# Altium footprint library Footprint.PcbLib: 137 footprints (part 3 of 9)
Each footprint in its own frame and in the unit in brackets; x right, y up, seen from the top. Pads: shape width x height; smd on the part's side, far side on the other; paste and mask are expansions set on the pad; w line width, h text height; cw(c..) or ccw(c..) is an arc to the next point about the centre after c.
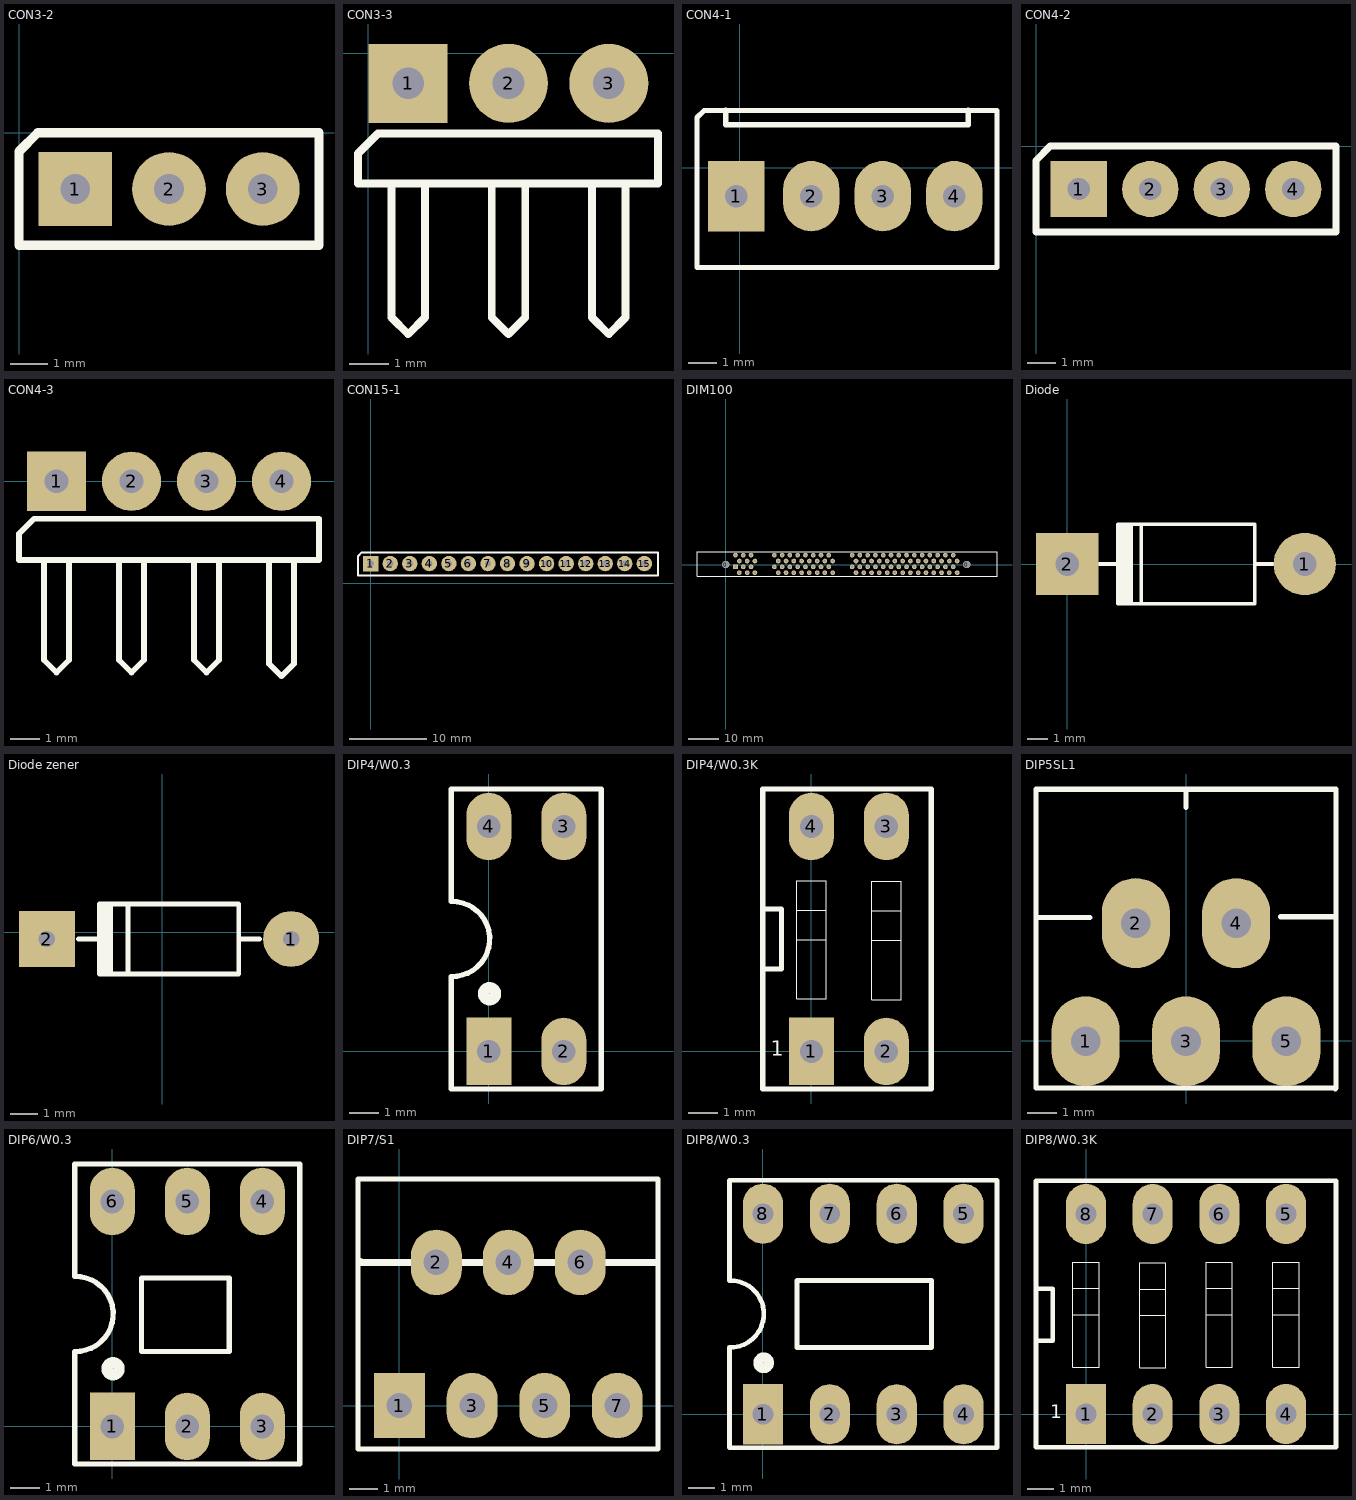
[diagram p2: the footprints below, top view; thin cyan lines are the x and y axes]

## CON3-2 [mm] "CON3 THANG"
pads (3):
  rect 2x2 hole 0.8: 1(1.524,-1.524)
  round 2 hole 0.8: 2(4.064,-1.524) 3(6.604,-1.524)
Top Overlay:
  lines w0.254: 0,-3.048 0,-0.508 0.508,0 8.128,0 8.128,-3.048 0,-3.048
3D body "Samtec-TSW-103-07-G-S.step": height 2.11, standoff -8.81, extent 0.254,-2.794 7.874,-0.254

## CON3-3 [mm] "CON3 L"
pads (3):
  rect 2x2 hole 0.8: 1(1.016,-0.762)
  round 2 hole 0.8: 2(3.556,-0.762) 3(6.096,-0.762)
Top Overlay:
  lines w0.2: 0.593,-3.302 0.593,-6.689 1.016,-7.112 1.439,-6.689 1.439,-3.302 ; 3.133,-3.302 3.133,-6.689 3.556,-7.112 3.979,-6.689 3.979,-3.302 ; 5.673,-3.302 5.673,-6.689 6.096,-7.112 6.519,-6.689 6.519,-3.302 ; -0.254,-3.302 7.341,-3.302 7.341,-2.032 0.254,-2.032 -0.254,-2.54 -0.254,-3.302
3D body "User Library-0_1inch pin strip right angle (2).step": height 4.35, standoff -2.97, extent -0.254,-7.762 7.366,0.508

## CON4-1 [mm] "CON4 pin khuyet"
pads (4):
  rect 2x2.5 hole 0.8: 1(-0.127,-1.016)
  oval 2x2.5 hole 0.8: 2(2.54,-1.016) 3(5.08,-1.016) 4(7.62,-1.016)
Top Overlay:
  lines w0.178: -1.524,-3.556 9.144,-3.556 9.144,-0.254 9.144,2.032 -1.27,2.032 -1.524,1.778 -1.524,-3.556
  lines w0.2: -0.508,2.032 -0.508,1.524 7.874,1.524 8.128,1.524 8.128,2.032
3D body "User Library-molex kk 0_1in latching 4 way vertical header.step": height 11.9, standoff -3.34, extent -1.27,-4.064 8.89,1.778

## CON4-2 [mm] "CON4 THANG"
pads (4):
  rect 2x2 hole 0.8: 1(1.524,-1.524)
  round 2 hole 0.8: 2(4.064,-1.524) 3(6.604,-1.524) 4(9.144,-1.524)
Top Overlay:
  lines w0.254: 0,-3.048 10.668,-3.048 10.668,0 0.508,0 0,-0.508 0,-3.048
3D body "User Library-Header 4 Vertical.step": height 8.13, standoff -2.72, extent 0.508,-2.692 10.262,-0.356

## CON4-3 [mm] "CON4 L"
pads (4):
  rect 2x2 hole 0.8: 1(2.54,0)
  round 2 hole 0.8: 2(5.08,0) 3(7.62,0) 4(10.16,0)
Top Overlay:
  lines w0.2: 2.117,-2.667 2.117,-6.054 2.54,-6.477 2.963,-6.054 2.963,-2.667 ; 4.657,-2.667 4.657,-6.054 5.08,-6.477 5.503,-6.054 5.503,-2.667 ; 7.197,-2.667 7.197,-6.054 7.62,-6.477 8.043,-6.054 8.043,-2.667 ; 9.737,-2.794 9.737,-6.181 10.16,-6.604 10.583,-6.181 10.583,-2.794 ; 1.27,-2.667 1.27,-1.778 1.778,-1.27 11.43,-1.27 11.43,-2.667 1.27,-2.667
3D body "CircuitWorks-HEADER 2_54 HORIZONTAL 4X.step": height 2.75, standoff -1.75, extent 1.27,-9.79 11.43,0.53

## CON15-1 [mm] "CON15 PIN THANG"
pads (15):
  rect 2x2 hole 0.8: 1(0,2.54)
  round 2 hole 0.8: 2(2.54,2.54) 3(5.08,2.54) 4(7.62,2.54) 5(10.16,2.54) 6(12.7,2.54) 7(15.24,2.54) 8(17.78,2.54) 9(20.32,2.54) 10(22.86,2.54) 11(25.4,2.54) 12(27.94,2.54) 13(30.48,2.54) 14(33.02,2.54) 15(35.56,2.54)
Top Overlay:
  lines w0.254: -1.653,0.963 37.338,0.963 37.338,4.011 -1.145,4.011 -1.653,3.503 -1.653,0.963
3D body "6215.stp": height 9.6, standoff -2.55, extent -1.27,1.27 36.83,3.81

## DIM100 [mil] "DIM100 (RAM)"
pads (102):
  round 94.49 hole 94.49: 0(0,0) 0(3100,0)
  rect 60x60 hole 30: 1(124.8,-30.31)
  round 60 hole 30: 2(174.8,-105.51) 3(224.8,-30.31) 4(274.8,-105.51) 5(324.8,-30.31) 6(374.8,-105.51) 7(624.8,-30.31) 8(674.8,-105.51) 9(724.8,-30.31) 10(774.8,-105.51) 11(824.8,-30.31) 12(874.8,-105.51) 13(924.8,-30.31) 14(974.8,-105.51) 15(1024.8,-30.31) 16(1074.8,-105.51) 17(1124.8,-30.31) 18(1174.8,-105.51) 19(1224.8,-30.31) 20(1274.8,-105.51) 21(1324.8,-30.31) 22(1374.8,-105.51) 23(1624.8,-30.31) 24(1674.8,-105.51) 25(1724.8,-30.31) 26(1774.8,-105.51) 27(1824.8,-30.31) 28(1874.8,-105.51) 29(1924.8,-30.31) 30(1974.8,-105.51) 31(2024.8,-30.31) 32(2074.8,-105.51) 33(2124.8,-30.31) 34(2174.8,-105.51) 35(2224.8,-30.31) 36(2274.8,-105.51) 37(2324.8,-30.31) 38(2374.8,-105.51) 39(2424.8,-30.31) 40(2474.8,-105.51) 41(2524.8,-30.31) 42(2574.8,-105.51) 43(2624.8,-30.31) 44(2674.8,-105.51) 45(2724.8,-30.31) 46(2774.8,-105.51) 47(2824.8,-30.31) 48(2874.8,-105.51) 49(2924.8,-30.31) 50(2974.8,-105.51) 51(124.8,120.08) 52(174.8,44.88) 53(224.8,120.08) 54(274.8,44.88) 55(324.8,120.08) 56(374.8,44.88) 57(624.8,120.08) 58(674.8,44.88) 59(724.8,120.08) 60(774.8,44.88) 61(824.8,120.08) 62(874.8,44.88) 63(924.8,120.08) 64(974.8,44.88) 65(1024.8,120.08) 66(1074.8,44.88) 67(1124.8,120.08) 68(1174.8,44.88) 69(1224.8,120.08) 70(1274.8,44.88) 71(1324.8,120.08) 72(1374.8,44.88) 73(1624.8,120.08) 74(1674.8,44.88) 75(1724.8,120.08) 76(1774.8,44.88) 77(1824.8,120.08) 78(1874.8,44.88) 79(1924.8,120.08) 80(1974.8,44.88) 81(2024.8,120.08) 82(2074.8,44.88) 83(2124.8,120.08) 84(2174.8,44.88) 85(2224.8,120.08) 86(2274.8,44.88) 87(2324.8,120.08) 88(2374.8,44.88) 89(2424.8,120.08) 90(2474.8,44.88) 91(2524.8,120.08) 92(2574.8,44.88) 93(2624.8,120.08) 94(2674.8,44.88) 95(2724.8,120.08) 96(2774.8,44.88) 97(2824.8,120.08) 98(2874.8,44.88) 99(2924.8,120.08) 100(2974.8,44.88)
Top Overlay:
  lines w7.87: -370.08,-150.79 -370.08,164.17 3488.19,164.17 3488.19,-150.79 -370.08,-150.79

## Diode [mm] "diode pitch = 450mil"
height 2.54
pads (2):
  round 3 hole 1.143: 1(11.43,0)
  rect 3x3 hole 1.143: 2(0,0)
Top Overlay:
  rectangle: 2.413,-1.905 3.175,1.905
  lines w0.178: 1.549,0 2.438,0 ; 2.438,-0.787 2.438,0 ; 2.438,0.813 2.438,0 ; 3.556,-1.905 3.556,1.905 ; 9.017,0 9.931,0 ; 2.438,-1.905 9.017,-1.905 9.017,1.905 2.438,1.905 2.438,-1.905
3D body "SW3DPS-DIODE0_4-DEFAULT.STEP": height 2.55, standoff -2.54, extent 0.127,-1.194 11.049,1.372

## Diode zener [mil] "diode zener 1A"
pads (2):
  round 80 hole 23.62: 1(185,-10)
  rect 80x80 hole 23.62: 2(-165,-10)
Top Overlay:
  rectangle: -90,-60 -70,40
  lines w7: -120,-10 -90,-10 ; -90,-26 -90,-10 ; -90,11 -90,-10 ; -49,-60 -49,37 ; 110,-10 140,-10 ; -90,-10 -90,40 110,40 110,-60 -90,-60 -90,-10
3D body "SW3dPS-do_35.STEP": height 84.5, standoff -100, extent -201.49,-43 219.49,26

## DIP4/W0.3 [mil] "4 PIN, W 300mil, Pin to pin 100mil"
height 100
pads (4):
  rect 60x90 hole 31: 1(0,0)
  oval 60x90 hole 31: 2(100,0) 3(100,300) 4(0,300)
Top Overlay:
  circle w15: c1,77 r8
  lines w7: -50.38,100.05 ccw(c-48.69,150.02) -50,200 ; -50,100 -50,-50 150,-50 150,350 -50,350 -50,201
3D body "SW3DPS-DIP4-DEFAULT.STEP": height 169.69, standoff -129.13, extent -59.06,-10 159.06,304.96

## DIP4/W0.3K [mil] "4 PINs, W=400mil,Pitch=100mil"
height 100
pads (4):
  rect 60x90 hole 31: 1(0,0)
  oval 60x90 hole 31: 2(100,0) 3(100,300) 4(0,300)
Top Overlay:
  lines w1.5: -19.68,149 19.68,149 ; -19.68,188.37 19.68,188.37 ; 80.31,148 119.69,148 ; 80.31,187.37 119.69,187.37 ; -19.68,70.26 19.68,70.26 19.68,227.74 -19.68,227.74 -19.68,70.26 ; 80.31,69.26 119.69,69.26 119.69,226.74 80.31,226.74 80.31,69.26
  lines w7: -65,110 -40,110 -40,190 -65,190 ; -65,-50 160,-50 160,350 -65,350 -65,-50
  text "1" at -54,-6 h20
3D body "User Library-Switch-Piano-DIP-2.STEP": height 354.33, standoff -157.48, extent -66.22,-103.43 170,343.43

## DIP5SL1 [mm] "DIP5SL1 (TDA2003,"
pads (5):
  oval 2.3x3.048 hole 1: 1(-3.406,-0.019) 2(-1.706,3.981) 3(-0.006,-0.019) 4(1.694,3.981) 5(3.394,-0.019)
Top Overlay:
  lines w0.178: -5.082,4.172 -3.253,4.172 ; -0.006,7.899 -0.006,8.484 ; 3.198,4.198 5.027,4.198 ; -5.086,-1.6 5.024,-1.6 5.049,-1.626 5.074,-1.6 5.074,8.516 -5.086,8.516 -5.086,-1.6
3D body "TO220-5.STEP": height 18.81, standoff -9.47, extent -4.999,-0.265 5.201,8.291

## DIP6/W0.3 [mil] "6 PIN, W 300mil, Pin to pin 100mil"
height 100
pads (6):
  rect 60x90 hole 31.5: 1(0,0)
  oval 60x90 hole 31.5: 2(100,0) 3(200,0) 4(200,300) 5(100,300) 6(0,300)
Top Overlay:
  circle w15: c1,77 r8
  lines w7: -50.38,100.05 ccw(c-48.69,150.02) -50,200 ; -50,100 -50,-50 250,-50 250,350 -50,350 -50,201 ; 39,100 156,100 156,198 39,198 39,100
3D body "SW3DPS-DIP6-DEFAULT.STEP": height 169.69, standoff -129.13, extent -58.11,-7.48 260,307.48

## DIP7/S1 [mil]
pads (7):
  rect 70x90 hole 35: 1(0,0)
  oval 70x90 hole 35: 2(51,197) 3(100,0) 4(150,197) 5(200,0) 6(249,197) 7(300,0)
Top Overlay:
  lines w7: -57,-60 356,-60 356,312 -57,312 -57,-60
  lines w10: -54,198 -54,197 354,197
3D body "User Library-TO-220(T).STEP": height 756.77, standoff -77.87, extent -50.57,-11.02 351,311.02

## DIP8/W0.3 [mil] "8 PIN, W 300mil, pitch=100mil"
height 100
pads (8):
  rect 60x90 hole 31: 1(0,0)
  oval 60x90 hole 31: 2(100,0) 3(200,0) 4(300,0) 5(300,300) 6(200,300) 7(100,300) 8(0,300)
Top Overlay:
  circle w15: c1,77 r8
  lines w7: -50.38,100.05 ccw(c-48.69,150.02) -50,200 ; -50,100 -50,-50 350,-50 350,350 -50,350 -50,201 ; 51,100 252,100 252,200 51,200 51,100
3D body "SW3dPS-DIP8-CER.STEP": height 201.25, standoff -129.47, extent -50,-40 350,336.4

## DIP8/W0.3K [mil] "8 PIN, W 400mil , L 450mil, Pin to pin 100mil For Switch"
height 100
pads (8):
  rect 60x90 hole 31: 1(0,0)
  oval 60x90 hole 31: 2(100,0) 3(200,0) 4(300,0) 5(300,300) 6(200,300) 7(100,300) 8(0,300)
Top Overlay:
  lines w1.5: -19.68,149 19.68,149 ; -19.68,188.37 19.68,188.37 ; 80.31,148 119.69,148 ; 80.31,187.37 119.69,187.37 ; 180.31,149 219.69,149 ; 180.31,188.37 219.69,188.37 ; 280.31,149 319.69,149 ; 280.31,188.37 319.69,188.37 ; -19.68,70.26 19.68,70.26 19.68,227.74 -19.68,227.74 -19.68,70.26 ; 80.31,69.26 119.69,69.26 119.69,226.74 80.31,226.74 80.31,69.26 ; 180.31,70.26 219.69,70.26 219.69,227.74 180.31,227.74 180.31,70.26 ; 280.31,70.26 319.69,70.26 319.69,227.74 280.31,227.74 280.31,70.26
  lines w7: -75,68.5 -75,233 ; -75,110 -50,110 -50,188 -74,188 -75,189 ; -75,126 -75,-50 375,-50 375,350 -75,350 -75,176
  text "1" at -54,-6 h20
3D body "switch 4bank x1.STEP": height 158.27, standoff -9.84, extent -80,-45.08 377.87,345.08